# Altium footprint library mobinbyn-Header.PcbLib: 297 footprints (part 13 of 23) (continued)
## MHDR1X15-254P [mm] "Male Header 1X15 with 2.54 mm Pitch"
height 8.4
pads (15):
  rect 1.5x1.5 hole 0.9: 1(-17.78,0)
  round 1.5 hole 0.9: 2(-15.24,0) 3(-12.7,0) 4(-10.16,0) 5(-7.62,0) 6(-5.08,0) 7(-2.54,0) 8(0,0) 9(2.54,0) 10(5.08,0) 11(7.62,0) 12(10.16,0) 13(12.7,0) 14(15.24,0) 15(17.78,0)
Top Overlay:
  lines w0.254: -16.51,-0.762 -16.003,-1.268 -14.478,-1.268 -13.97,-0.76 -13.97,0.762 -14.479,1.272 -16.002,1.272 -16.51,0.764 ; -13.97,-0.762 -13.463,-1.268 -11.938,-1.268 -11.43,-0.76 -11.43,0.762 -11.939,1.272 -13.462,1.272 -13.97,0.764 ; -11.43,-0.762 -10.923,-1.268 -9.398,-1.268 -8.89,-0.76 -8.89,0.762 -9.399,1.272 -10.922,1.272 -11.43,0.764 ; -8.89,-0.762 -8.383,-1.268 -6.858,-1.268 -6.35,-0.76 -6.35,0.762 -6.859,1.272 -8.382,1.272 -8.89,0.764 ; -6.35,-0.762 -5.843,-1.268 -4.318,-1.268 -3.81,-0.76 -3.81,0.762 -4.319,1.272 -5.842,1.272 -6.35,0.764 ; -3.81,-0.762 -3.303,-1.268 -1.778,-1.268 -1.27,-0.76 -1.27,0.762 -1.779,1.272 -3.302,1.272 -3.81,0.764 ; -1.27,-0.762 -0.763,-1.268 0.762,-1.268 1.27,-0.76 1.27,0.762 0.761,1.272 -0.762,1.272 -1.27,0.764 ; 1.27,-0.762 1.777,-1.268 3.302,-1.268 3.81,-0.76 3.81,0.762 3.301,1.272 1.778,1.272 1.27,0.764 ; 3.81,-0.762 4.317,-1.268 5.842,-1.268 6.35,-0.76 6.35,0.762 5.841,1.272 4.318,1.272 3.81,0.764 ; 6.35,-0.762 6.857,-1.268 8.382,-1.268 8.89,-0.76 8.89,0.762 8.381,1.272 6.858,1.272 6.35,0.764 ; 8.89,-0.762 9.397,-1.268 10.922,-1.268 11.43,-0.76 11.43,0.762 10.921,1.272 9.398,1.272 8.89,0.764 ; 11.43,-0.762 11.937,-1.268 13.462,-1.268 13.97,-0.76 13.97,0.762 13.461,1.272 11.938,1.272 11.43,0.764 ; 13.97,-0.762 14.477,-1.268 16.002,-1.268 16.51,-0.76 16.51,0.762 16.001,1.272 14.478,1.272 13.97,0.764 ; 16.51,-0.762 17.017,-1.268 18.542,-1.268 19.05,-0.76 19.05,0.762 18.541,1.272 17.018,1.272 16.51,0.764 ; -19.05,-0.762 -19.05,0.764 -18.542,1.272 -17.019,1.272 -16.51,0.762 -16.51,-0.76 -17.018,-1.268 -18.543,-1.268 -19.05,-0.762
  text "15" at 18.288,-3.097 h1
  text "14" at 15.748,-3.145 h1
  text "13" at 13.208,-3.097 h1
  text "12" at 10.668,-3.097 h1
  text "11" at 8.128,-2.669 h1
  text "10" at 5.588,-3.097 h1
  text "9" at 3.048,-2.317 h1
  text "8" at 0.508,-2.364 h1
  text "7" at -2.032,-2.364 h1
  text "6" at -4.572,-2.317 h1
  text "5" at -7.112,-2.364 h1
  text "4" at -9.652,-2.412 h1
  text "3" at -12.192,-2.364 h1
  text "2" at -14.732,-2.364 h1
  text "1" at -17.272,-1.936 h1
  text "1" at -17.272,-1.936 h1
3D body "PIN.STEP": height 8.43, standoff -2.49, extent -19.05,-1.27 -16.51,1.27
3D body "PIN_mid.STEP": height 8.43, standoff -2.49, extent -16.51,-1.27 -13.97,1.27
3D body "PIN_mid.STEP": height 8.43, standoff -2.49, extent -13.97,-1.27 -11.43,1.27
3D body "PIN_mid.STEP": height 8.43, standoff -2.49, extent -11.43,-1.27 -8.89,1.27
3D body "PIN_mid.STEP": height 8.43, standoff -2.49, extent -8.89,-1.27 -6.35,1.27
3D body "PIN_mid.STEP": height 8.43, standoff -2.49, extent -6.35,-1.27 -3.81,1.27
3D body "PIN_mid.STEP": height 8.43, standoff -2.49, extent -3.81,-1.27 -1.27,1.27
3D body "PIN_mid.STEP": height 8.43, standoff -2.49, extent -1.27,-1.27 1.27,1.27
3D body "PIN_mid.STEP": height 8.43, standoff -2.49, extent 1.27,-1.27 3.81,1.27
3D body "PIN_mid.STEP": height 8.43, standoff -2.49, extent 3.81,-1.27 6.35,1.27
3D body "PIN_mid.STEP": height 8.43, standoff -2.49, extent 6.35,-1.27 8.89,1.27
3D body "PIN_mid.STEP": height 8.43, standoff -2.49, extent 8.89,-1.27 11.43,1.27
3D body "PIN_mid.STEP": height 8.43, standoff -2.49, extent 11.43,-1.27 13.97,1.27
3D body "PIN_mid.STEP": height 8.43, standoff -2.49, extent 13.97,-1.27 16.51,1.27
3D body "PIN.STEP": height 8.43, standoff -2.49, extent 16.51,-1.27 19.05,1.27

## MHDR1X15-254P - E [mm] "Male Header 1X15 with 2.54 mm Pitch"
height 8.4
pads (15):
  rect 1.5x1.5 hole 0.9: 1(-17.78,0)
  round 1.5 hole 0.9: 2(-15.24,0) 3(-12.7,0) 4(-10.16,0) 5(-7.62,0) 6(-5.08,0) 7(-2.54,0) 8(0,0) 9(2.54,0) 10(5.08,0) 11(7.62,0) 12(10.16,0) 13(12.7,0) 14(15.24,0) 15(17.78,0)
Top Overlay:
  lines w0.254: -16.51,-0.762 -16.003,-1.268 -14.478,-1.268 -13.97,-0.76 -13.97,0.762 -14.479,1.272 -16.002,1.272 -16.51,0.764 ; -13.97,-0.762 -13.463,-1.268 -11.938,-1.268 -11.43,-0.76 -11.43,0.762 -11.939,1.272 -13.462,1.272 -13.97,0.764 ; -11.43,-0.762 -10.923,-1.268 -9.398,-1.268 -8.89,-0.76 -8.89,0.762 -9.399,1.272 -10.922,1.272 -11.43,0.764 ; -8.89,-0.762 -8.383,-1.268 -6.858,-1.268 -6.35,-0.76 -6.35,0.762 -6.859,1.272 -8.382,1.272 -8.89,0.764 ; -6.35,-0.762 -5.843,-1.268 -4.318,-1.268 -3.81,-0.76 -3.81,0.762 -4.319,1.272 -5.842,1.272 -6.35,0.764 ; -3.81,-0.762 -3.303,-1.268 -1.778,-1.268 -1.27,-0.76 -1.27,0.762 -1.779,1.272 -3.302,1.272 -3.81,0.764 ; -1.27,-0.762 -0.763,-1.268 0.762,-1.268 1.27,-0.76 1.27,0.762 0.761,1.272 -0.762,1.272 -1.27,0.764 ; 1.27,-0.762 1.777,-1.268 3.302,-1.268 3.81,-0.76 3.81,0.762 3.301,1.272 1.778,1.272 1.27,0.764 ; 3.81,-0.762 4.317,-1.268 5.842,-1.268 6.35,-0.76 6.35,0.762 5.841,1.272 4.318,1.272 3.81,0.764 ; 6.35,-0.762 6.857,-1.268 8.382,-1.268 8.89,-0.76 8.89,0.762 8.381,1.272 6.858,1.272 6.35,0.764 ; 8.89,-0.762 9.397,-1.268 10.922,-1.268 11.43,-0.76 11.43,0.762 10.921,1.272 9.398,1.272 8.89,0.764 ; 11.43,-0.762 11.937,-1.268 13.462,-1.268 13.97,-0.76 13.97,0.762 13.461,1.272 11.938,1.272 11.43,0.764 ; 13.97,-0.762 14.477,-1.268 16.002,-1.268 16.51,-0.76 16.51,0.762 16.001,1.272 14.478,1.272 13.97,0.764 ; 16.51,-0.762 17.017,-1.268 18.542,-1.268 19.05,-0.76 19.05,0.762 18.541,1.272 17.018,1.272 16.51,0.764 ; -19.05,-0.762 -18.543,-1.268 -17.018,-1.268 -16.51,-0.76 -16.51,0.762 -17.019,1.272 -18.542,1.272 -19.05,0.764 -19.05,-0.762
3D body "PIN.STEP": height 8.43, standoff -2.49, extent 16.51,-1.27 19.05,1.27
3D body "PIN_mid.STEP": height 8.43, standoff -2.49, extent 13.97,-1.27 16.51,1.27
3D body "PIN_mid.STEP": height 8.43, standoff -2.49, extent 11.43,-1.27 13.97,1.27
3D body "PIN_mid.STEP": height 8.43, standoff -2.49, extent 8.89,-1.27 11.43,1.27
3D body "PIN_mid.STEP": height 8.43, standoff -2.49, extent 6.35,-1.27 8.89,1.27
3D body "PIN_mid.STEP": height 8.43, standoff -2.49, extent 3.81,-1.27 6.35,1.27
3D body "PIN_mid.STEP": height 8.43, standoff -2.49, extent 1.27,-1.27 3.81,1.27
3D body "PIN_mid.STEP": height 8.43, standoff -2.49, extent -1.27,-1.27 1.27,1.27
3D body "PIN_mid.STEP": height 8.43, standoff -2.49, extent -3.81,-1.27 -1.27,1.27
3D body "PIN_mid.STEP": height 8.43, standoff -2.49, extent -6.35,-1.27 -3.81,1.27
3D body "PIN_mid.STEP": height 8.43, standoff -2.49, extent -8.89,-1.27 -6.35,1.27
3D body "PIN_mid.STEP": height 8.43, standoff -2.49, extent -11.43,-1.27 -8.89,1.27
3D body "PIN_mid.STEP": height 8.43, standoff -2.49, extent -13.97,-1.27 -11.43,1.27
3D body "PIN_mid.STEP": height 8.43, standoff -2.49, extent -16.51,-1.27 -13.97,1.27
3D body "PIN.STEP": height 8.43, standoff -2.49, extent -19.05,-1.27 -16.51,1.27

## MHDR1X16-254P [mm] "Male Header 1X16 with 2.54 mm Pitch"
height 8.4
pads (16):
  rect 1.5x1.5 hole 0.9: 1(-19.05,0)
  round 1.5 hole 0.9: 2(-16.51,0) 3(-13.97,0) 4(-11.43,0) 5(-8.89,0) 6(-6.35,0) 7(-3.81,0) 8(-1.27,0) 9(1.27,0) 10(3.81,0) 11(6.35,0) 12(8.89,0) 13(11.43,0) 14(13.97,0) 15(16.51,0) 16(19.05,0)
Top Overlay:
  lines w0.254: -17.78,-0.762 -17.273,-1.268 -15.748,-1.268 -15.24,-0.76 -15.24,0.762 -15.749,1.272 -17.272,1.272 -17.78,0.764 ; -15.24,-0.762 -14.733,-1.268 -13.208,-1.268 -12.7,-0.76 -12.7,0.762 -13.209,1.272 -14.732,1.272 -15.24,0.764 ; -12.7,-0.762 -12.193,-1.268 -10.668,-1.268 -10.16,-0.76 -10.16,0.762 -10.669,1.272 -12.192,1.272 -12.7,0.764 ; -10.16,-0.762 -9.653,-1.268 -8.128,-1.268 -7.62,-0.76 -7.62,0.762 -8.129,1.272 -9.652,1.272 -10.16,0.764 ; -7.62,-0.762 -7.113,-1.268 -5.588,-1.268 -5.08,-0.76 -5.08,0.762 -5.589,1.272 -7.112,1.272 -7.62,0.764 ; -5.08,-0.762 -4.573,-1.268 -3.048,-1.268 -2.54,-0.76 -2.54,0.762 -3.049,1.272 -4.572,1.272 -5.08,0.764 ; -2.54,-0.762 -2.033,-1.268 -0.508,-1.268 0,-0.76 0,0.762 -0.509,1.272 -2.032,1.272 -2.54,0.764 ; 0,-0.762 0.507,-1.268 2.032,-1.268 2.54,-0.76 2.54,0.762 2.031,1.272 0.508,1.272 0,0.764 ; 2.54,-0.762 3.047,-1.268 4.572,-1.268 5.08,-0.76 5.08,0.762 4.571,1.272 3.048,1.272 2.54,0.764 ; 5.08,-0.762 5.587,-1.268 7.112,-1.268 7.62,-0.76 7.62,0.762 7.111,1.272 5.588,1.272 5.08,0.764 ; 7.62,-0.762 8.127,-1.268 9.652,-1.268 10.16,-0.76 10.16,0.762 9.651,1.272 8.128,1.272 7.62,0.764 ; 10.16,-0.762 10.667,-1.268 12.192,-1.268 12.7,-0.76 12.7,0.762 12.191,1.272 10.668,1.272 10.16,0.764 ; 12.7,-0.762 13.207,-1.268 14.732,-1.268 15.24,-0.76 15.24,0.762 14.731,1.272 13.208,1.272 12.7,0.764 ; 15.24,-0.762 15.747,-1.268 17.272,-1.268 17.78,-0.76 17.78,0.762 17.271,1.272 15.748,1.272 15.24,0.764 ; 17.78,-0.762 18.287,-1.268 19.812,-1.268 20.32,-0.76 20.32,0.762 19.811,1.272 18.288,1.272 17.78,0.764 ; -20.32,-0.762 -19.813,-1.268 -18.288,-1.268 -17.78,-0.76 -17.78,0.762 -18.289,1.272 -19.812,1.272 -20.32,0.764 -20.32,-0.762
  text "1" at -18.542,-1.936 h1
  text "1" at -18.542,-1.936 h1
  text "2" at -16.002,-2.364 h1
  text "3" at -13.462,-2.364 h1
  text "4" at -10.922,-2.412 h1
  text "5" at -8.382,-2.364 h1
  text "6" at -5.842,-2.317 h1
  text "7" at -3.302,-2.364 h1
  text "8" at -0.762,-2.364 h1
  text "9" at 1.778,-2.317 h1
  text "10" at 4.318,-3.097 h1
  text "11" at 6.858,-2.669 h1
  text "12" at 9.398,-3.097 h1
  text "13" at 11.938,-3.097 h1
  text "14" at 14.478,-3.145 h1
  text "15" at 17.018,-3.097 h1
  text "16" at 19.558,-3.05 h1
3D body "PIN.STEP": height 8.43, standoff -2.49, extent 17.78,-1.27 20.32,1.27
3D body "PIN_mid.STEP": height 8.43, standoff -2.49, extent 15.24,-1.27 17.78,1.27
3D body "PIN_mid.STEP": height 8.43, standoff -2.49, extent 12.7,-1.27 15.24,1.27
3D body "PIN_mid.STEP": height 8.43, standoff -2.49, extent 10.16,-1.27 12.7,1.27
3D body "PIN_mid.STEP": height 8.43, standoff -2.49, extent 7.62,-1.27 10.16,1.27
3D body "PIN_mid.STEP": height 8.43, standoff -2.49, extent 5.08,-1.27 7.62,1.27
3D body "PIN_mid.STEP": height 8.43, standoff -2.49, extent 2.54,-1.27 5.08,1.27
3D body "PIN_mid.STEP": height 8.43, standoff -2.49, extent 0,-1.27 2.54,1.27
3D body "PIN_mid.STEP": height 8.43, standoff -2.49, extent -2.54,-1.27 0,1.27
3D body "PIN_mid.STEP": height 8.43, standoff -2.49, extent -5.08,-1.27 -2.54,1.27
3D body "PIN_mid.STEP": height 8.43, standoff -2.49, extent -7.62,-1.27 -5.08,1.27
3D body "PIN_mid.STEP": height 8.43, standoff -2.49, extent -10.16,-1.27 -7.62,1.27
3D body "PIN_mid.STEP": height 8.43, standoff -2.49, extent -12.7,-1.27 -10.16,1.27
3D body "PIN_mid.STEP": height 8.43, standoff -2.49, extent -15.24,-1.27 -12.7,1.27
3D body "PIN_mid.STEP": height 8.43, standoff -2.49, extent -17.78,-1.27 -15.24,1.27
3D body "PIN.STEP": height 8.43, standoff -2.49, extent -20.32,-1.27 -17.78,1.27

## MHDR1X16-254P - E [mm] "Male Header 1X16 with 2.54 mm Pitch"
height 8.4
pads (16):
  rect 1.5x1.5 hole 0.9: 1(-19.05,0)
  round 1.5 hole 0.9: 2(-16.51,0) 3(-13.97,0) 4(-11.43,0) 5(-8.89,0) 6(-6.35,0) 7(-3.81,0) 8(-1.27,0) 9(1.27,0) 10(3.81,0) 11(6.35,0) 12(8.89,0) 13(11.43,0) 14(13.97,0) 15(16.51,0) 16(19.05,0)
Top Overlay:
  lines w0.254: -17.78,-0.762 -17.273,-1.268 -15.748,-1.268 -15.24,-0.76 -15.24,0.762 -15.749,1.272 -17.272,1.272 -17.78,0.764 ; -15.24,-0.762 -14.733,-1.268 -13.208,-1.268 -12.7,-0.76 -12.7,0.762 -13.209,1.272 -14.732,1.272 -15.24,0.764 ; -12.7,-0.762 -12.193,-1.268 -10.668,-1.268 -10.16,-0.76 -10.16,0.762 -10.669,1.272 -12.192,1.272 -12.7,0.764 ; -10.16,-0.762 -9.653,-1.268 -8.128,-1.268 -7.62,-0.76 -7.62,0.762 -8.129,1.272 -9.652,1.272 -10.16,0.764 ; -7.62,-0.762 -7.113,-1.268 -5.588,-1.268 -5.08,-0.76 -5.08,0.762 -5.589,1.272 -7.112,1.272 -7.62,0.764 ; -5.08,-0.762 -4.573,-1.268 -3.048,-1.268 -2.54,-0.76 -2.54,0.762 -3.049,1.272 -4.572,1.272 -5.08,0.764 ; -2.54,-0.762 -2.033,-1.268 -0.508,-1.268 0,-0.76 0,0.762 -0.509,1.272 -2.032,1.272 -2.54,0.764 ; 0,-0.762 0.507,-1.268 2.032,-1.268 2.54,-0.76 2.54,0.762 2.031,1.272 0.508,1.272 0,0.764 ; 2.54,-0.762 3.047,-1.268 4.572,-1.268 5.08,-0.76 5.08,0.762 4.571,1.272 3.048,1.272 2.54,0.764 ; 5.08,-0.762 5.587,-1.268 7.112,-1.268 7.62,-0.76 7.62,0.762 7.111,1.272 5.588,1.272 5.08,0.764 ; 7.62,-0.762 8.127,-1.268 9.652,-1.268 10.16,-0.76 10.16,0.762 9.651,1.272 8.128,1.272 7.62,0.764 ; 10.16,-0.762 10.667,-1.268 12.192,-1.268 12.7,-0.76 12.7,0.762 12.191,1.272 10.668,1.272 10.16,0.764 ; 12.7,-0.762 13.207,-1.268 14.732,-1.268 15.24,-0.76 15.24,0.762 14.731,1.272 13.208,1.272 12.7,0.764 ; 15.24,-0.762 15.747,-1.268 17.272,-1.268 17.78,-0.76 17.78,0.762 17.271,1.272 15.748,1.272 15.24,0.764 ; 17.78,-0.762 18.287,-1.268 19.812,-1.268 20.32,-0.76 20.32,0.762 19.811,1.272 18.288,1.272 17.78,0.764 ; -20.32,-0.762 -19.813,-1.268 -18.288,-1.268 -17.78,-0.76 -17.78,0.762 -18.289,1.272 -19.812,1.272 -20.32,0.764 -20.32,-0.762
3D body "PIN.STEP": height 8.43, standoff -2.49, extent -20.32,-1.27 -17.78,1.27
3D body "PIN_mid.STEP": height 8.43, standoff -2.49, extent -17.78,-1.27 -15.24,1.27
3D body "PIN_mid.STEP": height 8.43, standoff -2.49, extent -15.24,-1.27 -12.7,1.27
3D body "PIN_mid.STEP": height 8.43, standoff -2.49, extent -12.7,-1.27 -10.16,1.27
3D body "PIN_mid.STEP": height 8.43, standoff -2.49, extent -10.16,-1.27 -7.62,1.27
3D body "PIN_mid.STEP": height 8.43, standoff -2.49, extent -7.62,-1.27 -5.08,1.27
3D body "PIN_mid.STEP": height 8.43, standoff -2.49, extent -5.08,-1.27 -2.54,1.27
3D body "PIN_mid.STEP": height 8.43, standoff -2.49, extent -2.54,-1.27 0,1.27
3D body "PIN_mid.STEP": height 8.43, standoff -2.49, extent 0,-1.27 2.54,1.27
3D body "PIN_mid.STEP": height 8.43, standoff -2.49, extent 2.54,-1.27 5.08,1.27
3D body "PIN_mid.STEP": height 8.43, standoff -2.49, extent 5.08,-1.27 7.62,1.27
3D body "PIN_mid.STEP": height 8.43, standoff -2.49, extent 7.62,-1.27 10.16,1.27
3D body "PIN_mid.STEP": height 8.43, standoff -2.49, extent 10.16,-1.27 12.7,1.27
3D body "PIN_mid.STEP": height 8.43, standoff -2.49, extent 12.7,-1.27 15.24,1.27
3D body "PIN_mid.STEP": height 8.43, standoff -2.49, extent 15.24,-1.27 17.78,1.27
3D body "PIN.STEP": height 8.43, standoff -2.49, extent 17.78,-1.27 20.32,1.27

## MHDR1X17-254P [mm] "Male Header 1X17 with 2.54 mm Pitch"
height 8.4
pads (17):
  rect 1.5x1.5 hole 0.9: 1(-20.32,0)
  round 1.5 hole 0.9: 2(-17.78,0) 3(-15.24,0) 4(-12.7,0) 5(-10.16,0) 6(-7.62,0) 7(-5.08,0) 8(-2.54,0) 9(0,0) 10(2.54,0) 11(5.08,0) 12(7.62,0) 13(10.16,0) 14(12.7,0) 15(15.24,0) 16(17.78,0) 17(20.32,0)
Top Overlay:
  lines w0.254: -19.05,-0.762 -18.543,-1.268 -17.018,-1.268 -16.51,-0.76 -16.51,0.762 -17.019,1.272 -18.542,1.272 -19.05,0.764 ; -16.51,-0.762 -16.003,-1.268 -14.478,-1.268 -13.97,-0.76 -13.97,0.762 -14.479,1.272 -16.002,1.272 -16.51,0.764 ; -13.97,-0.762 -13.463,-1.268 -11.938,-1.268 -11.43,-0.76 -11.43,0.762 -11.939,1.272 -13.462,1.272 -13.97,0.764 ; -11.43,-0.762 -10.923,-1.268 -9.398,-1.268 -8.89,-0.76 -8.89,0.762 -9.399,1.272 -10.922,1.272 -11.43,0.764 ; -8.89,-0.762 -8.383,-1.268 -6.858,-1.268 -6.35,-0.76 -6.35,0.762 -6.859,1.272 -8.382,1.272 -8.89,0.764 ; -6.35,-0.762 -5.843,-1.268 -4.318,-1.268 -3.81,-0.76 -3.81,0.762 -4.319,1.272 -5.842,1.272 -6.35,0.764 ; -3.81,-0.762 -3.303,-1.268 -1.778,-1.268 -1.27,-0.76 -1.27,0.762 -1.779,1.272 -3.302,1.272 -3.81,0.764 ; -1.27,-0.762 -0.763,-1.268 0.762,-1.268 1.27,-0.76 1.27,0.762 0.761,1.272 -0.762,1.272 -1.27,0.764 ; 1.27,-0.762 1.777,-1.268 3.302,-1.268 3.81,-0.76 3.81,0.762 3.301,1.272 1.778,1.272 1.27,0.764 ; 3.81,-0.762 4.317,-1.268 5.842,-1.268 6.35,-0.76 6.35,0.762 5.841,1.272 4.318,1.272 3.81,0.764 ; 6.35,-0.762 6.857,-1.268 8.382,-1.268 8.89,-0.76 8.89,0.762 8.381,1.272 6.858,1.272 6.35,0.764 ; 8.89,-0.762 9.397,-1.268 10.922,-1.268 11.43,-0.76 11.43,0.762 10.921,1.272 9.398,1.272 8.89,0.764 ; 11.43,-0.762 11.937,-1.268 13.462,-1.268 13.97,-0.76 13.97,0.762 13.461,1.272 11.938,1.272 11.43,0.764 ; 13.97,-0.762 14.477,-1.268 16.002,-1.268 16.51,-0.76 16.51,0.762 16.001,1.272 14.478,1.272 13.97,0.764 ; 16.51,-0.762 17.017,-1.268 18.542,-1.268 19.05,-0.76 19.05,0.762 18.541,1.272 17.018,1.272 16.51,0.764 ; 19.05,-0.762 19.557,-1.268 21.082,-1.268 21.59,-0.76 21.59,0.762 21.081,1.272 19.558,1.272 19.05,0.764 ; -21.59,-0.762 -21.59,0.764 -21.082,1.272 -19.559,1.272 -19.05,0.762 -19.05,-0.76 -19.558,-1.268 -21.083,-1.268 -21.59,-0.762
  text "1" at -19.812,-1.936 h1
  text "1" at -19.812,-1.936 h1
  text "2" at -17.272,-2.364 h1
  text "3" at -14.732,-2.364 h1
  text "4" at -12.192,-2.412 h1
  text "5" at -9.652,-2.364 h1
  text "6" at -7.112,-2.317 h1
  text "7" at -4.572,-2.364 h1
  text "8" at -2.032,-2.364 h1
  text "9" at 0.508,-2.317 h1
  text "10" at 3.048,-3.097 h1
  text "11" at 5.588,-2.669 h1
  text "12" at 8.128,-3.097 h1
  text "13" at 10.668,-3.097 h1
  text "14" at 13.208,-3.145 h1
  text "15" at 15.748,-3.097 h1
  text "16" at 18.288,-3.05 h1
  text "17" at 20.828,-3.097 h1
3D body "PIN.STEP": height 8.43, standoff -2.49, extent 19.05,-1.27 21.59,1.27
3D body "PIN_mid.STEP": height 8.43, standoff -2.49, extent 16.51,-1.27 19.05,1.27
3D body "PIN_mid.STEP": height 8.43, standoff -2.49, extent 13.97,-1.27 16.51,1.27
3D body "PIN_mid.STEP": height 8.43, standoff -2.49, extent 11.43,-1.27 13.97,1.27
3D body "PIN_mid.STEP": height 8.43, standoff -2.49, extent 8.89,-1.27 11.43,1.27
3D body "PIN_mid.STEP": height 8.43, standoff -2.49, extent 6.35,-1.27 8.89,1.27
3D body "PIN_mid.STEP": height 8.43, standoff -2.49, extent 3.81,-1.27 6.35,1.27
3D body "PIN_mid.STEP": height 8.43, standoff -2.49, extent 1.27,-1.27 3.81,1.27
3D body "PIN_mid.STEP": height 8.43, standoff -2.49, extent -1.27,-1.27 1.27,1.27
3D body "PIN_mid.STEP": height 8.43, standoff -2.49, extent -3.81,-1.27 -1.27,1.27
3D body "PIN_mid.STEP": height 8.43, standoff -2.49, extent -6.35,-1.27 -3.81,1.27
3D body "PIN_mid.STEP": height 8.43, standoff -2.49, extent -8.89,-1.27 -6.35,1.27
3D body "PIN_mid.STEP": height 8.43, standoff -2.49, extent -11.43,-1.27 -8.89,1.27
3D body "PIN_mid.STEP": height 8.43, standoff -2.49, extent -13.97,-1.27 -11.43,1.27
3D body "PIN_mid.STEP": height 8.43, standoff -2.49, extent -16.51,-1.27 -13.97,1.27
3D body "PIN_mid.STEP": height 8.43, standoff -2.49, extent -19.05,-1.27 -16.51,1.27
3D body "PIN.STEP": height 8.43, standoff -2.49, extent -21.59,-1.27 -19.05,1.27

## MHDR1X17-254P - E [mm] "Male Header 1X17 with 2.54 mm Pitch"
height 8.4
pads (17):
  rect 1.5x1.5 hole 0.9: 1(-20.32,0)
  round 1.5 hole 0.9: 2(-17.78,0) 3(-15.24,0) 4(-12.7,0) 5(-10.16,0) 6(-7.62,0) 7(-5.08,0) 8(-2.54,0) 9(0,0) 10(2.54,0) 11(5.08,0) 12(7.62,0) 13(10.16,0) 14(12.7,0) 15(15.24,0) 16(17.78,0) 17(20.32,0)
Top Overlay:
  lines w0.254: -19.05,-0.762 -18.543,-1.268 -17.018,-1.268 -16.51,-0.76 -16.51,0.762 -17.019,1.272 -18.542,1.272 -19.05,0.764 ; -16.51,-0.762 -16.003,-1.268 -14.478,-1.268 -13.97,-0.76 -13.97,0.762 -14.479,1.272 -16.002,1.272 -16.51,0.764 ; -13.97,-0.762 -13.463,-1.268 -11.938,-1.268 -11.43,-0.76 -11.43,0.762 -11.939,1.272 -13.462,1.272 -13.97,0.764 ; -11.43,-0.762 -10.923,-1.268 -9.398,-1.268 -8.89,-0.76 -8.89,0.762 -9.399,1.272 -10.922,1.272 -11.43,0.764 ; -8.89,-0.762 -8.383,-1.268 -6.858,-1.268 -6.35,-0.76 -6.35,0.762 -6.859,1.272 -8.382,1.272 -8.89,0.764 ; -6.35,-0.762 -5.843,-1.268 -4.318,-1.268 -3.81,-0.76 -3.81,0.762 -4.319,1.272 -5.842,1.272 -6.35,0.764 ; -3.81,-0.762 -3.303,-1.268 -1.778,-1.268 -1.27,-0.76 -1.27,0.762 -1.779,1.272 -3.302,1.272 -3.81,0.764 ; -1.27,-0.762 -0.763,-1.268 0.762,-1.268 1.27,-0.76 1.27,0.762 0.761,1.272 -0.762,1.272 -1.27,0.764 ; 1.27,-0.762 1.777,-1.268 3.302,-1.268 3.81,-0.76 3.81,0.762 3.301,1.272 1.778,1.272 1.27,0.764 ; 3.81,-0.762 4.317,-1.268 5.842,-1.268 6.35,-0.76 6.35,0.762 5.841,1.272 4.318,1.272 3.81,0.764 ; 6.35,-0.762 6.857,-1.268 8.382,-1.268 8.89,-0.76 8.89,0.762 8.381,1.272 6.858,1.272 6.35,0.764 ; 8.89,-0.762 9.397,-1.268 10.922,-1.268 11.43,-0.76 11.43,0.762 10.921,1.272 9.398,1.272 8.89,0.764 ; 11.43,-0.762 11.937,-1.268 13.462,-1.268 13.97,-0.76 13.97,0.762 13.461,1.272 11.938,1.272 11.43,0.764 ; 13.97,-0.762 14.477,-1.268 16.002,-1.268 16.51,-0.76 16.51,0.762 16.001,1.272 14.478,1.272 13.97,0.764 ; 16.51,-0.762 17.017,-1.268 18.542,-1.268 19.05,-0.76 19.05,0.762 18.541,1.272 17.018,1.272 16.51,0.764 ; 19.05,-0.762 19.557,-1.268 21.082,-1.268 21.59,-0.76 21.59,0.762 21.081,1.272 19.558,1.272 19.05,0.764 ; -21.59,-0.762 -21.083,-1.268 -19.558,-1.268 -19.05,-0.76 -19.05,0.762 -19.559,1.272 -21.082,1.272 -21.59,0.764 -21.59,-0.762
3D body "PIN.STEP": height 8.43, standoff -2.49, extent -21.59,-1.27 -19.05,1.27
3D body "PIN_mid.STEP": height 8.43, standoff -2.49, extent -19.05,-1.27 -16.51,1.27
3D body "PIN_mid.STEP": height 8.43, standoff -2.49, extent -16.51,-1.27 -13.97,1.27
3D body "PIN_mid.STEP": height 8.43, standoff -2.49, extent -13.97,-1.27 -11.43,1.27
3D body "PIN_mid.STEP": height 8.43, standoff -2.49, extent -11.43,-1.27 -8.89,1.27
3D body "PIN_mid.STEP": height 8.43, standoff -2.49, extent -8.89,-1.27 -6.35,1.27
3D body "PIN_mid.STEP": height 8.43, standoff -2.49, extent -6.35,-1.27 -3.81,1.27
3D body "PIN_mid.STEP": height 8.43, standoff -2.49, extent -3.81,-1.27 -1.27,1.27
3D body "PIN_mid.STEP": height 8.43, standoff -2.49, extent -1.27,-1.27 1.27,1.27
3D body "PIN_mid.STEP": height 8.43, standoff -2.49, extent 1.27,-1.27 3.81,1.27
3D body "PIN_mid.STEP": height 8.43, standoff -2.49, extent 3.81,-1.27 6.35,1.27
3D body "PIN_mid.STEP": height 8.43, standoff -2.49, extent 6.35,-1.27 8.89,1.27
3D body "PIN_mid.STEP": height 8.43, standoff -2.49, extent 8.89,-1.27 11.43,1.27
3D body "PIN_mid.STEP": height 8.43, standoff -2.49, extent 11.43,-1.27 13.97,1.27
3D body "PIN_mid.STEP": height 8.43, standoff -2.49, extent 13.97,-1.27 16.51,1.27
3D body "PIN_mid.STEP": height 8.43, standoff -2.49, extent 16.51,-1.27 19.05,1.27
3D body "PIN.STEP": height 8.43, standoff -2.49, extent 19.05,-1.27 21.59,1.27

## MHDR1X18-254P [mm] "Male Header 1X18 with 2.54 mm Pitch"
height 8.4
pads (18):
  rect 1.5x1.5 hole 0.9: 1(-21.59,0)
  round 1.5 hole 0.9: 2(-19.05,0) 3(-16.51,0) 4(-13.97,0) 5(-11.43,0) 6(-8.89,0) 7(-6.35,0) 8(-3.81,0) 9(-1.27,0) 10(1.27,0) 11(3.81,0) 12(6.35,0) 13(8.89,0) 14(11.43,0) 15(13.97,0) 16(16.51,0) 17(19.05,0) 18(21.59,0)
Top Overlay:
  lines w0.254: -20.32,-0.762 -19.813,-1.268 -18.288,-1.268 -17.78,-0.76 -17.78,0.762 -18.289,1.272 -19.812,1.272 -20.32,0.764 ; -17.78,-0.762 -17.273,-1.268 -15.748,-1.268 -15.24,-0.76 -15.24,0.762 -15.749,1.272 -17.272,1.272 -17.78,0.764 ; -15.24,-0.762 -14.733,-1.268 -13.208,-1.268 -12.7,-0.76 -12.7,0.762 -13.209,1.272 -14.732,1.272 -15.24,0.764 ; -12.7,-0.762 -12.193,-1.268 -10.668,-1.268 -10.16,-0.76 -10.16,0.762 -10.669,1.272 -12.192,1.272 -12.7,0.764 ; -10.16,-0.762 -9.653,-1.268 -8.128,-1.268 -7.62,-0.76 -7.62,0.762 -8.129,1.272 -9.652,1.272 -10.16,0.764 ; -7.62,-0.762 -7.113,-1.268 -5.588,-1.268 -5.08,-0.76 -5.08,0.762 -5.589,1.272 -7.112,1.272 -7.62,0.764 ; -5.08,-0.762 -4.573,-1.268 -3.048,-1.268 -2.54,-0.76 -2.54,0.762 -3.049,1.272 -4.572,1.272 -5.08,0.764 ; -2.54,-0.762 -2.033,-1.268 -0.508,-1.268 0,-0.76 0,0.762 -0.509,1.272 -2.032,1.272 -2.54,0.764 ; 0,-0.762 0.507,-1.268 2.032,-1.268 2.54,-0.76 2.54,0.762 2.031,1.272 0.508,1.272 0,0.764 ; 2.54,-0.762 3.047,-1.268 4.572,-1.268 5.08,-0.76 5.08,0.762 4.571,1.272 3.048,1.272 2.54,0.764 ; 5.08,-0.762 5.587,-1.268 7.112,-1.268 7.62,-0.76 7.62,0.762 7.111,1.272 5.588,1.272 5.08,0.764 ; 7.62,-0.762 8.127,-1.268 9.652,-1.268 10.16,-0.76 10.16,0.762 9.651,1.272 8.128,1.272 7.62,0.764 ; 10.16,-0.762 10.667,-1.268 12.192,-1.268 12.7,-0.76 12.7,0.762 12.191,1.272 10.668,1.272 10.16,0.764 ; 12.7,-0.762 13.207,-1.268 14.732,-1.268 15.24,-0.76 15.24,0.762 14.731,1.272 13.208,1.272 12.7,0.764 ; 15.24,-0.762 15.747,-1.268 17.272,-1.268 17.78,-0.76 17.78,0.762 17.271,1.272 15.748,1.272 15.24,0.764 ; 17.78,-0.762 18.287,-1.268 19.812,-1.268 20.32,-0.76 20.32,0.762 19.811,1.272 18.288,1.272 17.78,0.764 ; 20.32,-0.762 20.827,-1.268 22.352,-1.268 22.86,-0.76 22.86,0.762 22.351,1.272 20.828,1.272 20.32,0.764 ; -22.86,-0.762 -22.353,-1.268 -20.828,-1.268 -20.32,-0.76 -20.32,0.762 -20.829,1.272 -22.352,1.272 -22.86,0.764 -22.86,-0.762
  text "1" at -21.082,-1.936 h1
  text "1" at -21.082,-1.936 h1
  text "2" at -18.542,-2.364 h1
  text "3" at -16.002,-2.364 h1
  text "4" at -13.462,-2.412 h1
  text "5" at -10.922,-2.364 h1
  text "6" at -8.382,-2.317 h1
  text "7" at -5.842,-2.364 h1
  text "8" at -3.302,-2.364 h1
  text "9" at -0.762,-2.317 h1
  text "10" at 1.778,-3.097 h1
  text "11" at 4.318,-2.669 h1
  text "12" at 6.858,-3.097 h1
  text "13" at 9.398,-3.097 h1
  text "14" at 11.938,-3.145 h1
  text "15" at 14.478,-3.097 h1
  text "16" at 17.018,-3.05 h1
  text "17" at 19.558,-3.097 h1
  text "18" at 22.098,-3.097 h1
3D body "PIN.STEP": height 8.43, standoff -2.49, extent -22.86,-1.27 -20.32,1.27
3D body "PIN_mid.STEP": height 8.43, standoff -2.49, extent -20.32,-1.27 -17.78,1.27
3D body "PIN_mid.STEP": height 8.43, standoff -2.49, extent -17.78,-1.27 -15.24,1.27
3D body "PIN_mid.STEP": height 8.43, standoff -2.49, extent -15.24,-1.27 -12.7,1.27
3D body "PIN_mid.STEP": height 8.43, standoff -2.49, extent -12.7,-1.27 -10.16,1.27
3D body "PIN_mid.STEP": height 8.43, standoff -2.49, extent -10.16,-1.27 -7.62,1.27
3D body "PIN_mid.STEP": height 8.43, standoff -2.49, extent -7.62,-1.27 -5.08,1.27
3D body "PIN_mid.STEP": height 8.43, standoff -2.49, extent -5.08,-1.27 -2.54,1.27
3D body "PIN_mid.STEP": height 8.43, standoff -2.49, extent -2.54,-1.27 0,1.27
3D body "PIN_mid.STEP": height 8.43, standoff -2.49, extent 0,-1.27 2.54,1.27
3D body "PIN_mid.STEP": height 8.43, standoff -2.49, extent 2.54,-1.27 5.08,1.27
3D body "PIN_mid.STEP": height 8.43, standoff -2.49, extent 5.08,-1.27 7.62,1.27
3D body "PIN_mid.STEP": height 8.43, standoff -2.49, extent 7.62,-1.27 10.16,1.27
3D body "PIN_mid.STEP": height 8.43, standoff -2.49, extent 10.16,-1.27 12.7,1.27
3D body "PIN_mid.STEP": height 8.43, standoff -2.49, extent 12.7,-1.27 15.24,1.27
3D body "PIN_mid.STEP": height 8.43, standoff -2.49, extent 15.24,-1.27 17.78,1.27
3D body "PIN_mid.STEP": height 8.43, standoff -2.49, extent 17.78,-1.27 20.32,1.27
3D body "PIN.STEP": height 8.43, standoff -2.49, extent 20.32,-1.27 22.86,1.27